# Altium footprint library 2.02-SOT封装.PcbLib: 59 footprints (part 4 of 4)
Each footprint in its own frame and in the unit in brackets; x right, y up, seen from the top. Pads: shape width x height; smd on the part's side, far side on the other; paste and mask are expansions set on the pad; w line width, h text height; cw(c..) or ccw(c..) is an arc to the next point about the centre after c.
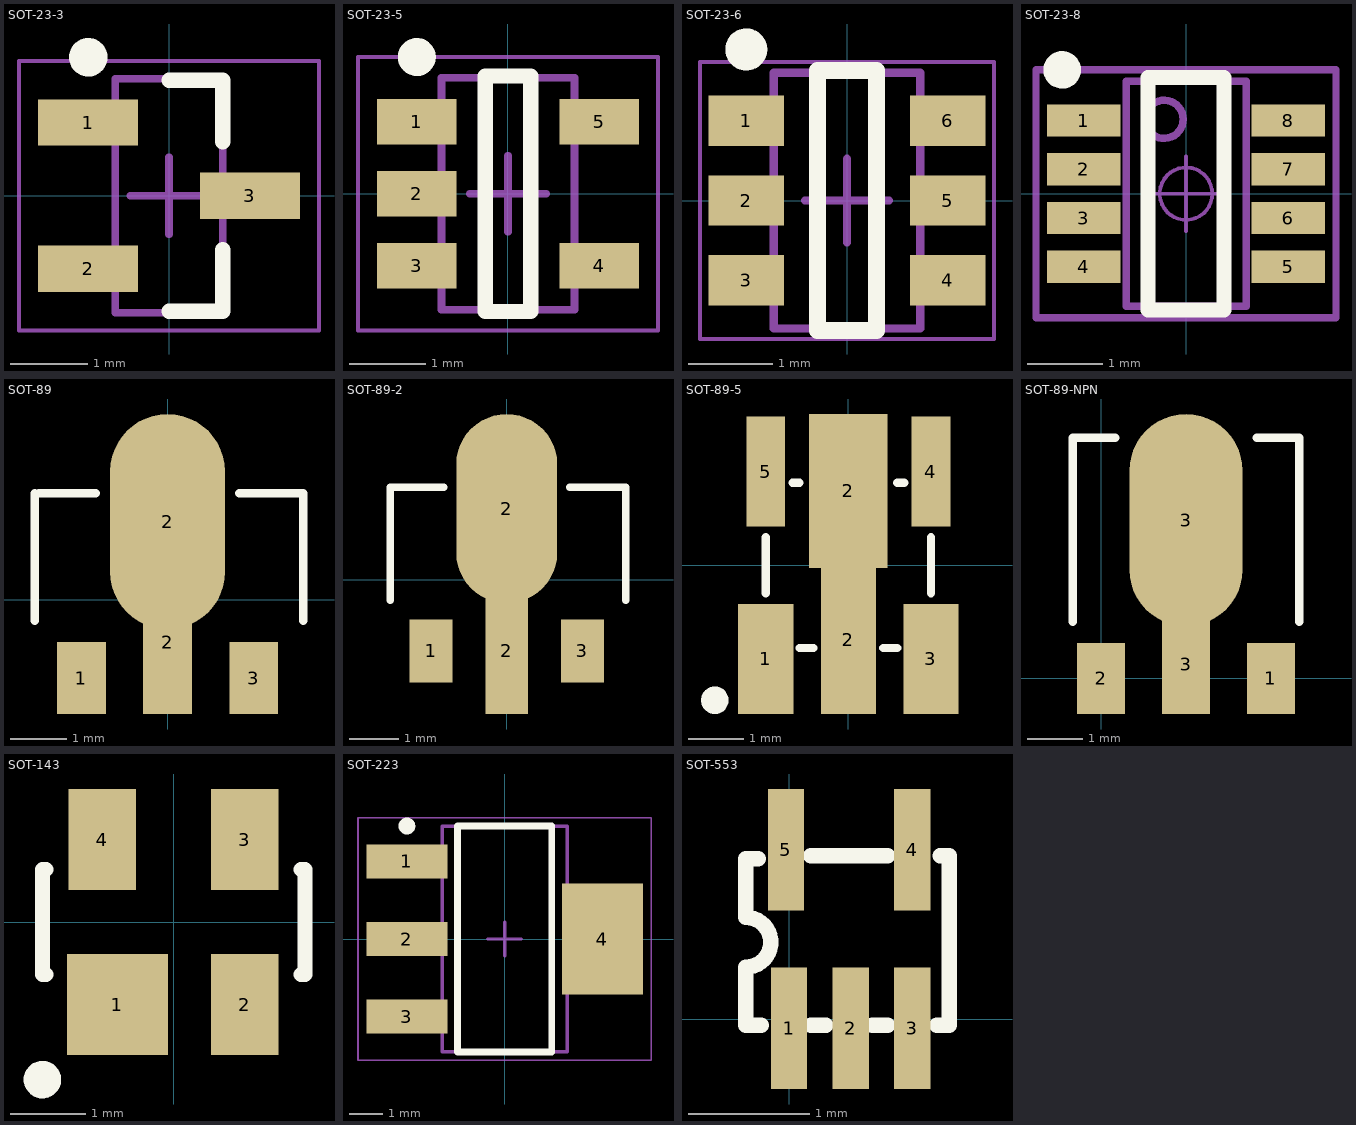
[diagram p3: the footprints below, top view; thin cyan lines are the x and y axes]

## SOT-23-3 [mm] "SOT23, 3-Leads, Body 2.9x1.3mm, Pitch 0.95mm, Lead Span 2.4mm, IPC Medium Density"
height 1.12
pads (3):
  rect 1.3x0.6 smd: 1(-1.05,0.95) 2(-1.05,-0.95) 3(1.05,0)
Top Overlay:
  circle w0.25: c-1.05,1.8 r0.125
  lines w0.2: 0,-1.5 0.7,-1.5 0.7,-0.7 ; 0,1.5 0.7,1.5 0.7,0.7
Mechanical 13:
  lines w0.1: -0.7,-1.52 -0.7,1.52 0.7,1.52 0.7,-1.52 -0.7,-1.52
Mechanical 15:
  lines w0.05: -1.95,-1.75 -1.95,1.75 1.95,1.75 1.95,-1.75 -1.95,-1.75
  lines w0.1: -0.5,0 0.5,0 ; 0,-0.5 0,0.5
3D body "SOT23-3-2.STEP": height 1.05, standoff 0, extent -1.2,-1.5 1.2,1.5

## SOT-23-5 [mm] "SOT23, 5-Leads, Body 2.9x1.6mm, Pitch 0.95mm, IPC Medium Density"
height 1.1
pads (5):
  rect 1.05x0.6 smd: 1(-1.2,0.95) 2(-1.2,0) 3(-1.2,-0.95) 4(1.2,-0.95) 5(1.2,0.95)
Top Overlay:
  circle w0.25: c-1.2,1.8 r0.125
  lines w0.2: -0.3,-1.55 -0.3,1.55 0.3,1.55 0.3,-1.55 -0.3,-1.55
Mechanical 13:
  lines w0.1: -0.875,-1.525 -0.875,1.525 0.875,1.525 0.875,-1.525 -0.875,-1.525
Mechanical 15:
  lines w0.05: -1.975,-1.8 1.975,-1.8 1.975,1.8 -1.975,1.8 -1.975,-1.8
  lines w0.1: -0.5,0 0.5,0 ; 0,-0.5 0,0.5
3D body "SOT23-5-2.STEP": height 1.15, standoff -0.03, extent -1.403,-1.5 1.404,1.5

## SOT-23-6 [mm] "SOT-23, 6-Leads, Body 2.90x1.60mm, Pitch 0.95mm, IPC High Density"
height 1.45
pads (6):
  rect 0.9x0.6 smd: 1(-1.2,0.95) 2(-1.2,0) 3(-1.2,-0.95) 4(1.2,-0.95) 5(1.2,0) 6(1.2,0.95)
Top Overlay:
  circle w0.25: c-1.2,1.8 r0.125
  lines w0.2: -0.35,-1.55 0.35,-1.55 0.35,1.55 -0.35,1.55 -0.35,-1.55
Mechanical 13:
  lines w0.1: -0.875,-1.525 -0.875,1.525 0.875,1.525 0.875,-1.525 -0.875,-1.525
Mechanical 15:
  lines w0.05: -1.75,-1.65 -1.75,1.65 1.75,1.65 1.75,-1.65 -1.75,-1.65
  lines w0.1: -0.5,0 0.5,0 ; 0,-0.5 0,0.5
3D body "SOT23-6.STEP": height 1.15, standoff -0.03, extent -1.403,-1.5 1.404,1.5

## SOT-23-8 [mil] "SOT23, 8-Leads, Body 2.9x1.75mm, Pitch 0.65mm"
pads (8):
  rect 38.5x17 smd paste+0: 1(-53.75,38.39) 2(-53.75,12.8) 3(-53.75,-12.8) 4(-53.75,-38.39) 5(53.75,-38.39) 6(53.75,-12.8) 7(53.75,12.8) 8(53.75,38.39)
Top Overlay:
  circle w9.84: c-64.99,64.99 r4.92
  lines w7.87: -19.99,-61.04 20.01,-61.04 20.01,61.01 -19.99,61.01 -19.99,-61.04
Mechanical 13:
  circle w3.94: c-11.49,39.04 r10
  lines w3.94: -31.48,-59.06 -31.48,59.05 31.51,59.05 31.51,-59.06 -31.48,-59.06
Mechanical 15:
  circle w1.97: c0.01,-0.01 r13.78
  lines w1.97: -19.68,-0.01 19.69,-0.01 ; 0.01,-19.7 0.01,19.67
  lines w3.94: -78.74,-65.01 -78.74,64.99 78.74,64.99 78.74,-65.01 -78.74,-65.01
3D body "SOT23-8.STEP": height 45.28, standoff 0, extent -55.25,-59.07 55.26,59.04

## SOT-89 [mil] "联系卖家 免费查找封装"
pads (4):
  rect 34.02x50 smd: 1(-60,-54.47) 3(60,-54.47)
  rect 34x100 smd: 2(0,-29.47)
  oval 80x150 smd: 2(0,54.47)
Top Overlay:
  lines w5.91: -92.52,-14.47 -92.52,74.19 ; -89.57,74.19 -50,74.19 ; 50,74.19 94.49,74.19 94.49,-14.47
3D body "SOT89.STEP": height 62.99, standoff 1.57, extent -89.56,-72.83 91.54,96.46

## SOT-89-2 [mil] "联系卖家 免费查找封装"
pads (4):
  rect 34.02x50 smd: 1(-60,-56.44) 3(60,-56.44)
  rect 34x100 smd: 2(0,-56.44)
  oval 80x150 smd: 2(0,56.44)
Top Overlay:
  lines w5.91: -92.52,-16.44 -92.52,73.21 -50,73.21 ; 50,73.21 94.49,73.21 94.49,-16.44
3D body "SOT89.STEP": height 62.99, standoff 1.57, extent -89.56,-73.81 91.54,95.48

## SOT-89-5 [mm] "联系卖家 免费查找封装"
pads (6):
  rect 1x2 smd: 1(-1.5,-1.7) 3(1.5,-1.7)
  rect 1x2.7 smd: 2(0,-1.35)
  rect 1.422x2.794 smd: 2(0,1.35)
  rect 0.7x2 smd: 4(1.5,1.7) 5(-1.5,1.7)
Top Overlay:
  circle w0.25: c-2.425,-2.45 r0.125
  lines w0.15: -1.5,-0.508 -1.5,0.508 ; -1.016,1.5 -0.889,1.5 ; -0.889,-1.5 -0.635,-1.5 ; 0.635,-1.5 0.889,-1.5 ; 0.889,1.5 1.016,1.5 ; 1.5,-0.508 1.5,0.508
3D body "SW3dPS-SOT895-A-PKG.STEP": height 1.51, standoff 0.01, extent -2.25,-1.9 2.25,1.9

## SOT-89-NPN [mil]
pads (4):
  rect 34.02x50 smd: 1(120,0) 2(0,0)
  rect 34x70 smd: 3(60,9.84)
  oval 80x150 smd: 3(60,111.81)
Top Overlay:
  lines w5.91: -20,40 -20,170 10,170 ; 110,170 140,170 140,40
3D body "SW3dPS-SOT89.STEP": height 62.57, standoff -0.76, extent -30.55,-16.65 150.55,150.67

## SOT-143 [mm] "SOT-143; 4 Leads; Body 3 x 2.6 mm, inc. leads (LxW max)"
height 1.1
pads (4):
  rect 1.35x1.35 smd: 1(-0.75,-1.1)
  rect 0.9x1.35 smd: 2(0.95,-1.1) 3(0.95,1.1) 4(-0.95,1.1)
Top Overlay:
  circle w0.25: c-1.75,-2.1 r0.125
  lines w0.2: -1.7,-0.7 -1.75,-0.7 -1.75,0.7 -1.7,0.7 ; 1.7,-0.7 1.75,-0.7 1.75,0.7 1.7,0.7
3D body: height 0.2, standoff 0, extent -1.149,0.408 -0.803,1.459
3D body: height 0.2, standoff 0, extent 0.784,0.408 1.13,1.459
3D body: height 0.2, standoff 0, extent -1.166,-1.503 -0.82,-0.452
3D body: height 0.2, standoff 0, extent 0.779,-1.464 1.125,-0.414
3D body: height 0.8, standoff 0, extent -1.516,-0.878 1.514,0.931

## SOT-223 [mm] "SOT223, 4-Leads, Body 6.5x3.5mm, Pitch 2.3mm, Lead Span 7mm, IPC Medium Density"
height 1.8
pads (4):
  rect 2.4x1 smd: 1(-2.9,2.3) 2(-2.9,0) 3(-2.9,-2.3)
  rect 2.4x3.3 smd: 4(2.9,0)
Top Overlay:
  circle w0.25: c-2.9,3.35 r0.125
  lines w0.2: -1.4,-3.35 1.4,-3.35 1.4,3.35 -1.4,3.35 -1.4,-3.35
Mechanical 13:
  lines w0.1: -1.855,-3.35 1.855,-3.35 1.855,3.35 -1.855,3.35 -1.855,-3.35
Mechanical 15:
  lines w0.05: -4.35,-3.6 4.35,-3.6 4.35,3.6 -4.35,3.6 -4.35,-3.6
  lines w0.1: -0.5,0 0.5,0 ; 0,-0.5 0,0.5
3D body "SOT223.STEP": height 1.65, standoff -0.02, extent -3.558,-3.3 3.458,3.2

## SOT-553 [mm] "联系卖家 免费查找封装"
pads (5):
  rect 0.3x1 smd: 1(0,-0.076) 2(0.508,-0.076) 3(1.016,-0.076) 4(1.016,1.397) 5(-0.025,1.397)
Top Overlay:
  lines w0.127: -0.254,1.321 -0.356,1.321 -0.356,0.838 cw(c-0.356,0.633) -0.356,0.429 -0.356,-0.051 -0.229,-0.051 ; 0.178,-0.051 0.305,-0.051 ; 0.178,1.346 0.813,1.346 ; 0.686,-0.051 0.813,-0.051 ; 1.219,-0.051 1.321,-0.051 1.321,1.346 1.245,1.346
3D body: height 0.4, standoff 0.08, extent -0.356,-0.051 1.321,1.321